# Altium schematic symbol library jlcpcb_2025_04_ferrites_extended_0603.schlib: 833 symbols (part 1 of 4) (continued)
## BLM18EG221TZ1D
designator FB?  Impedance @ Frequency: 220Ω@100MHz
Ferrite, 220Ω@100MHz, ±25%, 150mΩ, 1A, SMD 0603; Manufacturer: Murata Electronics; Manufacturer Part Number: BLM18EG221TZ1D; Package Size: 0603; JLCPCB Basic Part: No; JLCPCB Part Number: C710365; Supplier 1: LCSC; Category: Ferrite Beads; Supplier Part Number 1: C710365; Tolerance: ±25%; Rated Current: 1A; DC Resistance: 150mΩ; RoHS: Yes; ComponentLink1Description: Datasheet; ComponentLink1URL: https://wmsc.lcsc.com/wmsc/upload/file/pdf/v2/lcsc/2304140030_Murata-Electronics-BLM18EG221TZ1D_C710365.pdf; ComponentLink2Description: JLCPCB Part URL; ComponentLink2URL: https://jlcpcb.com/partdetail/C710365; ComponentLink3Description: LCSC Part URL; ComponentLink3URL: https://lcsc.com/product-detail/Ferrite-Beads_Murata-Electronics-Murata-Electronics-BLM18EG221TZ1D_C710365.html
footprint FB-0603 (0603 (1608M) Ferrite)
pins: 1, 2

## BLM18EG331TH1D
designator FB?  Impedance @ Frequency: 330Ω@100MHz
Ferrite, 330Ω@100MHz, ±25%, 210mΩ, 500mA, SMD 0603; Manufacturer: Murata Electronics; Manufacturer Part Number: BLM18EG331TH1D; Package Size: 0603; JLCPCB Basic Part: No; JLCPCB Part Number: C907937; Supplier 1: LCSC; Category: Ferrite Beads; Supplier Part Number 1: C907937; Tolerance: ±25%; Rated Current: 500mA; DC Resistance: 210mΩ; RoHS: Yes; ComponentLink1Description: Datasheet; ComponentLink1URL: https://wmsc.lcsc.com/wmsc/upload/file/pdf/v2/lcsc/2109221630_Murata-Electronics-BLM18EG331TH1D_C907937.pdf; ComponentLink2Description: JLCPCB Part URL; ComponentLink2URL: https://jlcpcb.com/partdetail/C907937; ComponentLink3Description: LCSC Part URL; ComponentLink3URL: https://lcsc.com/product-detail/Ferrite-Beads_Murata-Electronics-Murata-Electronics-BLM18EG331TH1D_C907937.html
footprint FB-0603 (0603 (1608M) Ferrite)
pins: 1, 2

## BLM18EG331TN1D
designator FB?  Impedance @ Frequency: 330Ω@100MHz
Ferrite, 330Ω@100MHz, ±25%, 210mΩ, 500mA, SMD 0603; Manufacturer: Murata Electronics; Manufacturer Part Number: BLM18EG331TN1D; Package Size: 0603; JLCPCB Basic Part: No; JLCPCB Part Number: C341513; Supplier 1: LCSC; Category: Ferrite Beads; Supplier Part Number 1: C341513; Tolerance: ±25%; Rated Current: 500mA; DC Resistance: 210mΩ; RoHS: Yes; ComponentLink1Description: Datasheet; ComponentLink1URL: https://wmsc.lcsc.com/wmsc/upload/file/pdf/v2/lcsc/1912111437_Murata-Electronics-BLM18EG331TN1D_C341513.pdf; ComponentLink2Description: JLCPCB Part URL; ComponentLink2URL: https://jlcpcb.com/partdetail/C341513; ComponentLink3Description: LCSC Part URL; ComponentLink3URL: https://lcsc.com/product-detail/Ferrite-Beads_Murata-Electronics-Murata-Electronics-BLM18EG331TN1D_C341513.html
footprint FB-0603 (0603 (1608M) Ferrite)
pins: 1, 2

## BLM18EG471SN1D
designator FB?  Impedance @ Frequency: 470Ω@100MHz
Ferrite, 470Ω@100MHz, ±25%, 210mΩ, 500mA, SMD 0603; Manufacturer: Murata Electronics; Manufacturer Part Number: BLM18EG471SN1D; Package Size: 0603; JLCPCB Basic Part: No; JLCPCB Part Number: C337880; Supplier 1: LCSC; Category: Ferrite Beads; Supplier Part Number 1: C337880; Tolerance: ±25%; Rated Current: 500mA; DC Resistance: 210mΩ; RoHS: Yes; ComponentLink1Description: Datasheet; ComponentLink1URL: https://wmsc.lcsc.com/wmsc/upload/file/pdf/v2/lcsc/2304140030_Murata-Electronics-BLM18EG471SN1D_C337880.pdf; ComponentLink2Description: JLCPCB Part URL; ComponentLink2URL: https://jlcpcb.com/partdetail/C337880; ComponentLink3Description: LCSC Part URL; ComponentLink3URL: https://lcsc.com/product-detail/Ferrite-Beads_Murata-Electronics-Murata-Electronics-BLM18EG471SN1D_C337880.html
footprint FB-0603 (0603 (1608M) Ferrite)
pins: 1, 2

## BLM18EG601SH1D
designator FB?  Impedance @ Frequency: 600Ω@100MHz
Ferrite, 600Ω@100MHz, 350mΩ, SMD 0603; Manufacturer: Murata Electronics; Manufacturer Part Number: BLM18EG601SH1D; Package Size: 0603; JLCPCB Basic Part: No; JLCPCB Part Number: C180490; Supplier 1: LCSC; Category: Ferrite Beads; Supplier Part Number 1: C180490; DC Resistance: 350mΩ; RoHS: Yes; ComponentLink1Description: Datasheet; ComponentLink1URL: https://wmsc.lcsc.com/wmsc/upload/file/pdf/v2/lcsc/2308111441_Murata-Electronics-BLM18EG601SH1D_C180490.pdf; ComponentLink2Description: JLCPCB Part URL; ComponentLink2URL: https://jlcpcb.com/partdetail/C180490; ComponentLink3Description: LCSC Part URL; ComponentLink3URL: https://lcsc.com/product-detail/Ferrite-Beads_Murata-Electronics-Murata-Electronics-BLM18EG601SH1D_C180490.html
pins: 1, 2

## BLM18EG601SN1D
designator FB?  Impedance @ Frequency: 600Ω@100MHz
Ferrite, 600Ω@100MHz, ±25%, 350mΩ, 500mA, SMD 0603; Manufacturer: Murata Electronics; Manufacturer Part Number: BLM18EG601SN1D; Package Size: 0603; JLCPCB Basic Part: No; JLCPCB Part Number: C20345; Supplier 1: LCSC; Category: Ferrite Beads; Supplier Part Number 1: C20345; Tolerance: ±25%; Rated Current: 500mA; DC Resistance: 350mΩ; RoHS: Yes; ComponentLink1Description: Datasheet; ComponentLink1URL: https://wmsc.lcsc.com/wmsc/upload/file/pdf/v2/lcsc/2304140030_Murata-Electronics-BLM18EG601SN1D_C20345.pdf; ComponentLink2Description: JLCPCB Part URL; ComponentLink2URL: https://jlcpcb.com/partdetail/C20345; ComponentLink3Description: LCSC Part URL; ComponentLink3URL: https://lcsc.com/product-detail/Ferrite-Beads_Murata-Electronics-Murata-Electronics-BLM18EG601SN1D_C20345.html
footprint FB-0603 (0603 (1608M) Ferrite)
pins: 1, 2

## BLM18GG471SN1D
designator FB?  Impedance @ Frequency: 470Ω@100MHz
Ferrite, 470Ω@100MHz, ±25%, 1Ω, 200mA, SMD 0603; Manufacturer: Murata Electronics; Manufacturer Part Number: BLM18GG471SN1D; Package Size: 0603; JLCPCB Basic Part: No; JLCPCB Part Number: C88977; Supplier 1: LCSC; Category: Ferrite Beads; Supplier Part Number 1: C88977; Tolerance: ±25%; Rated Current: 200mA; DC Resistance: 1Ω; RoHS: Yes; ComponentLink1Description: Datasheet; ComponentLink1URL: https://wmsc.lcsc.com/wmsc/upload/file/pdf/v2/lcsc/1810311122_Murata-Electronics-BLM18GG471SN1D_C88977.pdf; ComponentLink2Description: JLCPCB Part URL; ComponentLink2URL: https://jlcpcb.com/partdetail/C88977; ComponentLink3Description: LCSC Part URL; ComponentLink3URL: https://lcsc.com/product-detail/Ferrite-Beads_Murata-Electronics-Murata-Electronics-BLM18GG471SN1D_C88977.html
footprint FB-0603 (0603 (1608M) Ferrite)
pins: 1, 2

## BLM18HB121SN1D
designator FB?  Impedance @ Frequency: 120Ω@100MHz
Ferrite, 120Ω@100MHz, ±25%, 500mΩ, 200mA, SMD 0603; Manufacturer: Murata Electronics; Manufacturer Part Number: BLM18HB121SN1D; Package Size: 0603; JLCPCB Basic Part: No; JLCPCB Part Number: C14710; Supplier 1: LCSC; Category: Ferrite Beads; Supplier Part Number 1: C14710; Tolerance: ±25%; Rated Current: 200mA; DC Resistance: 500mΩ; RoHS: Yes; ComponentLink1Description: Datasheet; ComponentLink1URL: https://wmsc.lcsc.com/wmsc/upload/file/pdf/v2/lcsc/2304140030_Murata-Electronics-BLM18HB121SN1D_C14710.pdf; ComponentLink2Description: JLCPCB Part URL; ComponentLink2URL: https://jlcpcb.com/partdetail/C14710; ComponentLink3Description: LCSC Part URL; ComponentLink3URL: https://lcsc.com/product-detail/Ferrite-Beads_Murata-Electronics-Murata-Electronics-BLM18HB121SN1D_C14710.html
footprint FB-0603 (0603 (1608M) Ferrite)
pins: 1, 2

## BLM18HB221SN1D
designator FB?  Impedance @ Frequency: 220Ω@100MHz
Ferrite, 220Ω@100MHz, ±25%, 800mΩ, 100mA, SMD 0603; Manufacturer: Murata Electronics; Manufacturer Part Number: BLM18HB221SN1D; Package Size: 0603; JLCPCB Basic Part: No; JLCPCB Part Number: C437401; Supplier 1: LCSC; Category: Ferrite Beads; Supplier Part Number 1: C437401; Tolerance: ±25%; Rated Current: 100mA; DC Resistance: 800mΩ; RoHS: Yes; ComponentLink1Description: Datasheet; ComponentLink1URL: https://wmsc.lcsc.com/wmsc/upload/file/pdf/v2/lcsc/2304140030_Murata-Electronics-BLM18HB221SN1D_C437401.pdf; ComponentLink2Description: JLCPCB Part URL; ComponentLink2URL: https://jlcpcb.com/partdetail/C437401; ComponentLink3Description: LCSC Part URL; ComponentLink3URL: https://lcsc.com/product-detail/Ferrite-Beads_Murata-Electronics-Murata-Electronics-BLM18HB221SN1D_C437401.html
footprint FB-0603 (0603 (1608M) Ferrite)
pins: 1, 2

## BLM18HB331SN1D
designator FB?  Impedance @ Frequency: 330Ω@100MHz
Ferrite, 330Ω@100MHz, ±25%, 1.2Ω, 50mA, SMD 0603; Manufacturer: Murata Electronics; Manufacturer Part Number: BLM18HB331SN1D; Package Size: 0603; JLCPCB Basic Part: No; JLCPCB Part Number: C701277; Supplier 1: LCSC; Category: Ferrite Beads; Supplier Part Number 1: C701277; Tolerance: ±25%; Rated Current: 50mA; DC Resistance: 1.2Ω; RoHS: Yes; ComponentLink1Description: Datasheet; ComponentLink1URL: https://wmsc.lcsc.com/wmsc/upload/file/pdf/v2/lcsc/2010151208_Murata-Electronics-BLM18HB331SN1D_C701277.pdf; ComponentLink2Description: JLCPCB Part URL; ComponentLink2URL: https://jlcpcb.com/partdetail/C701277; ComponentLink3Description: LCSC Part URL; ComponentLink3URL: https://lcsc.com/product-detail/Ferrite-Beads_Murata-Electronics-Murata-Electronics-BLM18HB331SN1D_C701277.html
footprint FB-0603 (0603 (1608M) Ferrite)
pins: 1, 2

## BLM18HD102SH1D
designator FB?  Impedance @ Frequency: 1kΩ@100MHz
Ferrite, 1kΩ@100MHz, ±25%, 1.8Ω, 50mA, SMD 0603; Manufacturer: Murata Electronics; Manufacturer Part Number: BLM18HD102SH1D; Package Size: 0603; JLCPCB Basic Part: No; JLCPCB Part Number: C440132; Supplier 1: LCSC; Category: Ferrite Beads; Supplier Part Number 1: C440132; Tolerance: ±25%; Rated Current: 50mA; DC Resistance: 1.8Ω; RoHS: Yes; ComponentLink1Description: Datasheet; ComponentLink1URL: https://wmsc.lcsc.com/wmsc/upload/file/pdf/v2/lcsc/2304140030_Murata-Electronics-BLM18HD102SH1D_C440132.pdf; ComponentLink2Description: JLCPCB Part URL; ComponentLink2URL: https://jlcpcb.com/partdetail/C440132; ComponentLink3Description: LCSC Part URL; ComponentLink3URL: https://lcsc.com/product-detail/Ferrite-Beads_Murata-Electronics-Murata-Electronics-BLM18HD102SH1D_C440132.html
footprint FB-0603 (0603 (1608M) Ferrite)
pins: 1, 2

## BLM18HD102SN1D
designator FB?  Impedance @ Frequency: 1kΩ@100MHz
Ferrite, 1kΩ@100MHz, ±25%, 1.8Ω, 50mA, SMD 0603; Manufacturer: Murata Electronics; Manufacturer Part Number: BLM18HD102SN1D; Package Size: 0603; JLCPCB Basic Part: No; JLCPCB Part Number: C113026; Supplier 1: LCSC; Category: Ferrite Beads; Supplier Part Number 1: C113026; Tolerance: ±25%; Rated Current: 50mA; DC Resistance: 1.8Ω; RoHS: Yes; ComponentLink1Description: Datasheet; ComponentLink1URL: https://wmsc.lcsc.com/wmsc/upload/file/pdf/v2/lcsc/2304140030_Murata-Electronics-BLM18HD102SN1D_C113026.pdf; ComponentLink2Description: JLCPCB Part URL; ComponentLink2URL: https://jlcpcb.com/partdetail/C113026; ComponentLink3Description: LCSC Part URL; ComponentLink3URL: https://lcsc.com/product-detail/Ferrite-Beads_Murata-Electronics-Murata-Electronics-BLM18HD102SN1D_C113026.html
footprint FB-0603 (0603 (1608M) Ferrite)
pins: 1, 2

## BLM18HD471SH1D
designator FB?  Impedance @ Frequency: 470Ω@100MHz
Ferrite, 470Ω@100MHz, ±25%, 1.2Ω, 100mA, SMD 0603; Manufacturer: Murata Electronics; Manufacturer Part Number: BLM18HD471SH1D; Package Size: 0603; JLCPCB Basic Part: No; JLCPCB Part Number: C1852587; Supplier 1: LCSC; Category: Ferrite Beads; Supplier Part Number 1: C1852587; Tolerance: ±25%; Rated Current: 100mA; DC Resistance: 1.2Ω; RoHS: Yes; ComponentLink1Description: Datasheet; ComponentLink1URL: https://wmsc.lcsc.com/wmsc/upload/file/pdf/v2/lcsc/2201271000_Murata-Electronics-BLM18HD471SH1D_C1852587.pdf; ComponentLink2Description: JLCPCB Part URL; ComponentLink2URL: https://jlcpcb.com/partdetail/C1852587; ComponentLink3Description: LCSC Part URL; ComponentLink3URL: https://lcsc.com/product-detail/Ferrite-Beads_Murata-Electronics-Murata-Electronics-BLM18HD471SH1D_C1852587.html
footprint FB-0603 (0603 (1608M) Ferrite)
pins: 1, 2

## BLM18HD471SN1D
designator FB?  Impedance @ Frequency: 470Ω@100MHz
Ferrite, 470Ω@100MHz, ±25%, 1.2Ω, 100mA, SMD 0603; Manufacturer: Murata Electronics; Manufacturer Part Number: BLM18HD471SN1D; Package Size: 0603; JLCPCB Basic Part: No; JLCPCB Part Number: C113027; Supplier 1: LCSC; Category: Ferrite Beads; Supplier Part Number 1: C113027; Tolerance: ±25%; Rated Current: 100mA; DC Resistance: 1.2Ω; RoHS: Yes; ComponentLink1Description: Datasheet; ComponentLink1URL: https://wmsc.lcsc.com/wmsc/upload/file/pdf/v2/lcsc/2304140030_Murata-Electronics-BLM18HD471SN1D_C113027.pdf; ComponentLink2Description: JLCPCB Part URL; ComponentLink2URL: https://jlcpcb.com/partdetail/C113027; ComponentLink3Description: LCSC Part URL; ComponentLink3URL: https://lcsc.com/product-detail/Ferrite-Beads_Murata-Electronics-Murata-Electronics-BLM18HD471SN1D_C113027.html
footprint FB-0603 (0603 (1608M) Ferrite)
pins: 1, 2

## BLM18HD601SH1D
designator FB?  Impedance @ Frequency: 600Ω@100MHz
Ferrite, 600Ω@100MHz, ±25%, 1.5Ω, 100mA, SMD 0603; Manufacturer: Murata Electronics; Manufacturer Part Number: BLM18HD601SH1D; Package Size: 0603; JLCPCB Basic Part: No; JLCPCB Part Number: C437402; Supplier 1: LCSC; Category: Ferrite Beads; Supplier Part Number 1: C437402; Tolerance: ±25%; Rated Current: 100mA; DC Resistance: 1.5Ω; RoHS: Yes; ComponentLink1Description: Datasheet; ComponentLink1URL: https://wmsc.lcsc.com/wmsc/upload/file/pdf/v2/lcsc/2304140030_Murata-Electronics-BLM18HD601SH1D_C437402.pdf; ComponentLink2Description: JLCPCB Part URL; ComponentLink2URL: https://jlcpcb.com/partdetail/C437402; ComponentLink3Description: LCSC Part URL; ComponentLink3URL: https://lcsc.com/product-detail/Ferrite-Beads_Murata-Electronics-Murata-Electronics-BLM18HD601SH1D_C437402.html
footprint FB-0603 (0603 (1608M) Ferrite)
pins: 1, 2

## BLM18HD601SN1D
designator FB?  Impedance @ Frequency: 600Ω@100MHz
Ferrite, 600Ω@100MHz, ±25%, 1.5Ω, 100mA, SMD 0603; Manufacturer: Murata Electronics; Manufacturer Part Number: BLM18HD601SN1D; Package Size: 0603; JLCPCB Basic Part: No; JLCPCB Part Number: C88978; Supplier 1: LCSC; Category: Ferrite Beads; Supplier Part Number 1: C88978; Tolerance: ±25%; Rated Current: 100mA; DC Resistance: 1.5Ω; RoHS: Yes; ComponentLink1Description: Datasheet; ComponentLink1URL: https://wmsc.lcsc.com/wmsc/upload/file/pdf/v2/lcsc/2304140030_Murata-Electronics-BLM18HD601SN1D_C88978.pdf; ComponentLink2Description: JLCPCB Part URL; ComponentLink2URL: https://jlcpcb.com/partdetail/C88978; ComponentLink3Description: LCSC Part URL; ComponentLink3URL: https://lcsc.com/product-detail/Ferrite-Beads_Murata-Electronics-Murata-Electronics-BLM18HD601SN1D_C88978.html
footprint FB-0603 (0603 (1608M) Ferrite)
pins: 1, 2

## BLM18HE102SN1D
designator FB?  Impedance @ Frequency: 1kΩ@100MHz
Ferrite, 1kΩ@100MHz, ±25%, 350mΩ, 600mA, SMD 0603; Manufacturer: Murata Electronics; Manufacturer Part Number: BLM18HE102SN1D; Package Size: 0603; JLCPCB Basic Part: No; JLCPCB Part Number: C85828; Supplier 1: LCSC; Category: Ferrite Beads; Supplier Part Number 1: C85828; Tolerance: ±25%; Rated Current: 600mA; DC Resistance: 350mΩ; RoHS: Yes; ComponentLink1Description: Datasheet; ComponentLink1URL: https://wmsc.lcsc.com/wmsc/upload/file/pdf/v2/lcsc/2304140030_Murata-Electronics-BLM18HE102SN1D_C85828.pdf; ComponentLink2Description: JLCPCB Part URL; ComponentLink2URL: https://jlcpcb.com/partdetail/C85828; ComponentLink3Description: LCSC Part URL; ComponentLink3URL: https://lcsc.com/product-detail/Ferrite-Beads_Murata-Electronics-Murata-Electronics-BLM18HE102SN1D_C85828.html
footprint FB-0603 (0603 (1608M) Ferrite)
pins: 1, 2

## BLM18HE102SZ1D
designator FB?  Impedance @ Frequency: 1kΩ@100MHz
Ferrite, 1kΩ@100MHz, ±25%, 350mΩ, 600mA, SMD 0603; Manufacturer: Murata Electronics; Manufacturer Part Number: BLM18HE102SZ1D; Package Size: 0603; JLCPCB Basic Part: No; JLCPCB Part Number: C524529; Supplier 1: LCSC; Category: Ferrite Beads; Supplier Part Number 1: C524529; Tolerance: ±25%; Rated Current: 600mA; DC Resistance: 350mΩ; RoHS: Yes; ComponentLink1Description: Datasheet; ComponentLink1URL: https://wmsc.lcsc.com/wmsc/upload/file/pdf/v2/lcsc/2007031830_Murata-Electronics-BLM18HE102SZ1D_C524529.pdf; ComponentLink2Description: JLCPCB Part URL; ComponentLink2URL: https://jlcpcb.com/partdetail/C524529; ComponentLink3Description: LCSC Part URL; ComponentLink3URL: https://lcsc.com/product-detail/Ferrite-Beads_Murata-Electronics-Murata-Electronics-BLM18HE102SZ1D_C524529.html
footprint FB-0603 (0603 (1608M) Ferrite)
pins: 1, 2

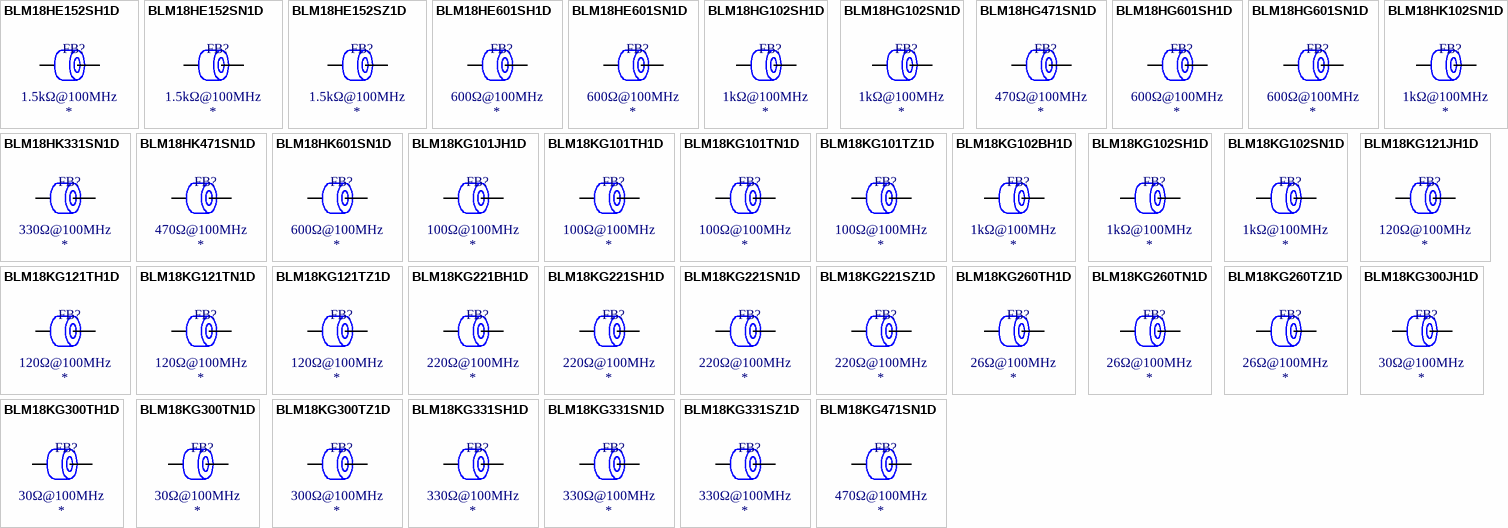
[diagram p3: symbols BLM18HE152SH1D to BLM18KG471SN1D]

## BLM18HE152SH1D
designator FB?  Impedance @ Frequency: 1.5kΩ@100MHz
Ferrite, 1.5kΩ@100MHz, ±25%, 500mΩ, 500mA, SMD 0603; Manufacturer: Murata Electronics; Manufacturer Part Number: BLM18HE152SH1D; Package Size: 0603; JLCPCB Basic Part: No; JLCPCB Part Number: C596494; Supplier 1: LCSC; Category: Ferrite Beads; Supplier Part Number 1: C596494; Tolerance: ±25%; Rated Current: 500mA; DC Resistance: 500mΩ; RoHS: Yes; ComponentLink1Description: Datasheet; ComponentLink1URL: https://wmsc.lcsc.com/wmsc/upload/file/pdf/v2/lcsc/2304140030_Murata-Electronics-BLM18HE152SH1D_C596494.pdf; ComponentLink2Description: JLCPCB Part URL; ComponentLink2URL: https://jlcpcb.com/partdetail/C596494; ComponentLink3Description: LCSC Part URL; ComponentLink3URL: https://lcsc.com/product-detail/Ferrite-Beads_Murata-Electronics-Murata-Electronics-BLM18HE152SH1D_C596494.html
footprint FB-0603 (0603 (1608M) Ferrite)
pins: 1, 2

## BLM18HE152SN1D
designator FB?  Impedance @ Frequency: 1.5kΩ@100MHz
Ferrite, 1.5kΩ@100MHz, ±25%, 500mΩ, 500mA, SMD 0603; Manufacturer: Murata Electronics; Manufacturer Part Number: BLM18HE152SN1D; Package Size: 0603; JLCPCB Basic Part: No; JLCPCB Part Number: C82155; Supplier 1: LCSC; Category: Ferrite Beads; Supplier Part Number 1: C82155; Tolerance: ±25%; Rated Current: 500mA; DC Resistance: 500mΩ; RoHS: Yes; ComponentLink1Description: Datasheet; ComponentLink1URL: https://wmsc.lcsc.com/wmsc/upload/file/pdf/v2/lcsc/2304140030_Murata-Electronics-BLM18HE152SN1D_C82155.pdf; ComponentLink2Description: JLCPCB Part URL; ComponentLink2URL: https://jlcpcb.com/partdetail/C82155; ComponentLink3Description: LCSC Part URL; ComponentLink3URL: https://lcsc.com/product-detail/Ferrite-Beads_Murata-Electronics-Murata-Electronics-BLM18HE152SN1D_C82155.html
footprint FB-0603 (0603 (1608M) Ferrite)
pins: 1, 2

## BLM18HE152SZ1D
designator FB?  Impedance @ Frequency: 1.5kΩ@100MHz
Ferrite, 1.5kΩ@100MHz, ±25%, 500mΩ, 500mA, SMD 0603; Manufacturer: Murata Electronics; Manufacturer Part Number: BLM18HE152SZ1D; Package Size: 0603; JLCPCB Basic Part: No; JLCPCB Part Number: C437403; Supplier 1: LCSC; Category: Ferrite Beads; Supplier Part Number 1: C437403; Tolerance: ±25%; Rated Current: 500mA; DC Resistance: 500mΩ; RoHS: Yes; ComponentLink1Description: Datasheet; ComponentLink1URL: https://wmsc.lcsc.com/wmsc/upload/file/pdf/v2/lcsc/2304140030_Murata-Electronics-BLM18HE152SZ1D_C437403.pdf; ComponentLink2Description: JLCPCB Part URL; ComponentLink2URL: https://jlcpcb.com/partdetail/C437403; ComponentLink3Description: LCSC Part URL; ComponentLink3URL: https://lcsc.com/product-detail/Ferrite-Beads_Murata-Electronics-Murata-Electronics-BLM18HE152SZ1D_C437403.html
footprint FB-0603 (0603 (1608M) Ferrite)
pins: 1, 2

## BLM18HE601SH1D
designator FB?  Impedance @ Frequency: 600Ω@100MHz
Ferrite, 600Ω@100MHz, ±25%, 250mΩ, 800mA, SMD 0603; Manufacturer: Murata Electronics; Manufacturer Part Number: BLM18HE601SH1D; Package Size: 0603; JLCPCB Basic Part: No; JLCPCB Part Number: C882978; Supplier 1: LCSC; Category: Ferrite Beads; Supplier Part Number 1: C882978; Tolerance: ±25%; Rated Current: 800mA; DC Resistance: 250mΩ; RoHS: Yes; ComponentLink1Description: Datasheet; ComponentLink1URL: https://wmsc.lcsc.com/wmsc/upload/file/pdf/v2/lcsc/2201242130_Murata-Electronics-BLM18HE601SH1D_C882978.pdf; ComponentLink2Description: JLCPCB Part URL; ComponentLink2URL: https://jlcpcb.com/partdetail/C882978; ComponentLink3Description: LCSC Part URL; ComponentLink3URL: https://lcsc.com/product-detail/Ferrite-Beads_Murata-Electronics-Murata-Electronics-BLM18HE601SH1D_C882978.html
footprint FB-0603 (0603 (1608M) Ferrite)
pins: 1, 2

## BLM18HE601SN1D
designator FB?  Impedance @ Frequency: 600Ω@100MHz
Ferrite, 600Ω@100MHz, ±25%, 250mΩ, 800mA, SMD 0603; Manufacturer: Murata Electronics; Manufacturer Part Number: BLM18HE601SN1D; Package Size: 0603; JLCPCB Basic Part: No; JLCPCB Part Number: C88979; Supplier 1: LCSC; Category: Ferrite Beads; Supplier Part Number 1: C88979; Tolerance: ±25%; Rated Current: 800mA; DC Resistance: 250mΩ; RoHS: Yes; ComponentLink1Description: Datasheet; ComponentLink1URL: https://wmsc.lcsc.com/wmsc/upload/file/pdf/v2/lcsc/2304140030_Murata-Electronics-BLM18HE601SN1D_C88979.pdf; ComponentLink2Description: JLCPCB Part URL; ComponentLink2URL: https://jlcpcb.com/partdetail/C88979; ComponentLink3Description: LCSC Part URL; ComponentLink3URL: https://lcsc.com/product-detail/Ferrite-Beads_Murata-Electronics-Murata-Electronics-BLM18HE601SN1D_C88979.html
footprint FB-0603 (0603 (1608M) Ferrite)
pins: 1, 2

## BLM18HG102SH1D
designator FB?  Impedance @ Frequency: 1kΩ@100MHz
Ferrite, 1kΩ@100MHz, 1.6Ω, SMD 0603; Manufacturer: Murata Electronics; Manufacturer Part Number: BLM18HG102SH1D; Package Size: 0603; JLCPCB Basic Part: No; JLCPCB Part Number: C527979; Supplier 1: LCSC; Category: Ferrite Beads; Supplier Part Number 1: C527979; DC Resistance: 1.6Ω; RoHS: Yes; ComponentLink1Description: Datasheet; ComponentLink1URL: https://wmsc.lcsc.com/wmsc/upload/file/pdf/v2/lcsc/2304140030_Murata-Electronics-BLM18HG102SH1D_C527979.pdf; ComponentLink2Description: JLCPCB Part URL; ComponentLink2URL: https://jlcpcb.com/partdetail/C527979; ComponentLink3Description: LCSC Part URL; ComponentLink3URL: https://lcsc.com/product-detail/Ferrite-Beads_Murata-Electronics-Murata-Electronics-BLM18HG102SH1D_C527979.html
pins: 1, 2

## BLM18HG102SN1D
designator FB?  Impedance @ Frequency: 1kΩ@100MHz
Ferrite, 1kΩ@100MHz, ±25%, 1.6Ω, 100mA, SMD 0603; Manufacturer: Murata Electronics; Manufacturer Part Number: BLM18HG102SN1D; Package Size: 0603; JLCPCB Basic Part: No; JLCPCB Part Number: C82848; Supplier 1: LCSC; Category: Ferrite Beads; Supplier Part Number 1: C82848; Tolerance: ±25%; Rated Current: 100mA; DC Resistance: 1.6Ω; RoHS: Yes; ComponentLink1Description: Datasheet; ComponentLink1URL: https://wmsc.lcsc.com/wmsc/upload/file/pdf/v2/lcsc/2304140030_Murata-Electronics-BLM18HG102SN1D_C82848.pdf; ComponentLink2Description: JLCPCB Part URL; ComponentLink2URL: https://jlcpcb.com/partdetail/C82848; ComponentLink3Description: LCSC Part URL; ComponentLink3URL: https://lcsc.com/product-detail/Ferrite-Beads_Murata-Electronics-Murata-Electronics-BLM18HG102SN1D_C82848.html
footprint FB-0603 (0603 (1608M) Ferrite)
pins: 1, 2

## BLM18HG471SN1D
designator FB?  Impedance @ Frequency: 470Ω@100MHz
Ferrite, 470Ω@100MHz, ±25%, 850mΩ, 200mA, SMD 0603; Manufacturer: Murata Electronics; Manufacturer Part Number: BLM18HG471SN1D; Package Size: 0603; JLCPCB Basic Part: No; JLCPCB Part Number: C85829; Supplier 1: LCSC; Category: Ferrite Beads; Supplier Part Number 1: C85829; Tolerance: ±25%; Rated Current: 200mA; DC Resistance: 850mΩ; RoHS: Yes; ComponentLink1Description: Datasheet; ComponentLink1URL: https://wmsc.lcsc.com/wmsc/upload/file/pdf/v2/lcsc/2304140030_Murata-Electronics-BLM18HG471SN1D_C85829.pdf; ComponentLink2Description: JLCPCB Part URL; ComponentLink2URL: https://jlcpcb.com/partdetail/C85829; ComponentLink3Description: LCSC Part URL; ComponentLink3URL: https://lcsc.com/product-detail/Ferrite-Beads_Murata-Electronics-Murata-Electronics-BLM18HG471SN1D_C85829.html
footprint FB-0603 (0603 (1608M) Ferrite)
pins: 1, 2

## BLM18HG601SH1D
designator FB?  Impedance @ Frequency: 600Ω@100MHz
Ferrite, 600Ω@100MHz, 1Ω, SMD 0603; Manufacturer: Murata Electronics; Manufacturer Part Number: BLM18HG601SH1D; Package Size: 0603; JLCPCB Basic Part: No; JLCPCB Part Number: C711568; Supplier 1: LCSC; Category: Ferrite Beads; Supplier Part Number 1: C711568; DC Resistance: 1Ω; RoHS: Yes; ComponentLink1Description: Datasheet; ComponentLink1URL: https://wmsc.lcsc.com/wmsc/upload/file/pdf/v2/lcsc/2304140030_Murata-Electronics-BLM18HG601SH1D_C711568.pdf; ComponentLink2Description: JLCPCB Part URL; ComponentLink2URL: https://jlcpcb.com/partdetail/C711568; ComponentLink3Description: LCSC Part URL; ComponentLink3URL: https://lcsc.com/product-detail/Ferrite-Beads_Murata-Electronics-Murata-Electronics-BLM18HG601SH1D_C711568.html
pins: 1, 2

## BLM18HG601SN1D
designator FB?  Impedance @ Frequency: 600Ω@100MHz
Ferrite, 600Ω@100MHz, ±25%, 1Ω, 200mA, SMD 0603; Manufacturer: Murata Electronics; Manufacturer Part Number: BLM18HG601SN1D; Package Size: 0603; JLCPCB Basic Part: No; JLCPCB Part Number: C85830; Supplier 1: LCSC; Category: Ferrite Beads; Supplier Part Number 1: C85830; Tolerance: ±25%; Rated Current: 200mA; DC Resistance: 1Ω; RoHS: Yes; ComponentLink1Description: Datasheet; ComponentLink1URL: https://wmsc.lcsc.com/wmsc/upload/file/pdf/v2/lcsc/2304140030_Murata-Electronics-BLM18HG601SN1D_C85830.pdf; ComponentLink2Description: JLCPCB Part URL; ComponentLink2URL: https://jlcpcb.com/partdetail/C85830; ComponentLink3Description: LCSC Part URL; ComponentLink3URL: https://lcsc.com/product-detail/Ferrite-Beads_Murata-Electronics-Murata-Electronics-BLM18HG601SN1D_C85830.html
footprint FB-0603 (0603 (1608M) Ferrite)
pins: 1, 2

## BLM18HK102SN1D
designator FB?  Impedance @ Frequency: 1kΩ@100MHz
Ferrite, 1kΩ@100MHz, ±25%, 1.5Ω, 50mA, SMD 0603; Manufacturer: Murata Electronics; Manufacturer Part Number: BLM18HK102SN1D; Package Size: 0603; JLCPCB Basic Part: No; JLCPCB Part Number: C97852; Supplier 1: LCSC; Category: Ferrite Beads; Supplier Part Number 1: C97852; Tolerance: ±25%; Rated Current: 50mA; DC Resistance: 1.5Ω; RoHS: Yes; ComponentLink1Description: Datasheet; ComponentLink1URL: https://wmsc.lcsc.com/wmsc/upload/file/pdf/v2/lcsc/2304140030_Murata-Electronics-BLM18HK102SN1D_C97852.pdf; ComponentLink2Description: JLCPCB Part URL; ComponentLink2URL: https://jlcpcb.com/partdetail/C97852; ComponentLink3Description: LCSC Part URL; ComponentLink3URL: https://lcsc.com/product-detail/Ferrite-Beads_Murata-Electronics-Murata-Electronics-BLM18HK102SN1D_C97852.html
footprint FB-0603 (0603 (1608M) Ferrite)
pins: 1, 2

## BLM18HK331SN1D
designator FB?  Impedance @ Frequency: 330Ω@100MHz
Ferrite, 330Ω@100MHz, ±25%, 500mΩ, 200mA, SMD 0603; Manufacturer: Murata Electronics; Manufacturer Part Number: BLM18HK331SN1D; Package Size: 0603; JLCPCB Basic Part: No; JLCPCB Part Number: C341514; Supplier 1: LCSC; Category: Ferrite Beads; Supplier Part Number 1: C341514; Tolerance: ±25%; Rated Current: 200mA; DC Resistance: 500mΩ; RoHS: Yes; ComponentLink1Description: Datasheet; ComponentLink1URL: https://wmsc.lcsc.com/wmsc/upload/file/pdf/v2/lcsc/2304140030_Murata-Electronics-BLM18HK331SN1D_C341514.pdf; ComponentLink2Description: JLCPCB Part URL; ComponentLink2URL: https://jlcpcb.com/partdetail/C341514; ComponentLink3Description: LCSC Part URL; ComponentLink3URL: https://lcsc.com/product-detail/Ferrite-Beads_Murata-Electronics-Murata-Electronics-BLM18HK331SN1D_C341514.html
footprint FB-0603 (0603 (1608M) Ferrite)
pins: 1, 2

## BLM18HK471SN1D
designator FB?  Impedance @ Frequency: 470Ω@100MHz
Ferrite, 470Ω@100MHz, ±25%, 700mΩ, 200mA, SMD 0603; Manufacturer: Murata Electronics; Manufacturer Part Number: BLM18HK471SN1D; Package Size: 0603; JLCPCB Basic Part: No; JLCPCB Part Number: C113028; Supplier 1: LCSC; Category: Ferrite Beads; Supplier Part Number 1: C113028; Tolerance: ±25%; Rated Current: 200mA; DC Resistance: 700mΩ; RoHS: Yes; ComponentLink1Description: Datasheet; ComponentLink1URL: https://wmsc.lcsc.com/wmsc/upload/file/pdf/v2/lcsc/2304140030_Murata-Electronics-BLM18HK471SN1D_C113028.pdf; ComponentLink2Description: JLCPCB Part URL; ComponentLink2URL: https://jlcpcb.com/partdetail/C113028; ComponentLink3Description: LCSC Part URL; ComponentLink3URL: https://lcsc.com/product-detail/Ferrite-Beads_Murata-Electronics-Murata-Electronics-BLM18HK471SN1D_C113028.html
footprint FB-0603 (0603 (1608M) Ferrite)
pins: 1, 2

## BLM18HK601SN1D
designator FB?  Impedance @ Frequency: 600Ω@100MHz
Ferrite, 600Ω@100MHz, ±25%, 900mΩ, 100mA, SMD 0603; Manufacturer: Murata Electronics; Manufacturer Part Number: BLM18HK601SN1D; Package Size: 0603; JLCPCB Basic Part: No; JLCPCB Part Number: C160980; Supplier 1: LCSC; Category: Ferrite Beads; Supplier Part Number 1: C160980; Tolerance: ±25%; Rated Current: 100mA; DC Resistance: 900mΩ; RoHS: Yes; ComponentLink1Description: Datasheet; ComponentLink1URL: https://wmsc.lcsc.com/wmsc/upload/file/pdf/v2/lcsc/1810311132_Murata-Electronics-BLM18HK601SN1D_C160980.pdf; ComponentLink2Description: JLCPCB Part URL; ComponentLink2URL: https://jlcpcb.com/partdetail/C160980; ComponentLink3Description: LCSC Part URL; ComponentLink3URL: https://lcsc.com/product-detail/Ferrite-Beads_Murata-Electronics-Murata-Electronics-BLM18HK601SN1D_C160980.html
footprint FB-0603 (0603 (1608M) Ferrite)
pins: 1, 2

## BLM18KG101JH1D
designator FB?  Impedance @ Frequency: 100Ω@100MHz
Ferrite, 100Ω@100MHz, ±25%, 30mΩ, 1.9A, SMD 0603; Manufacturer: Murata Electronics; Manufacturer Part Number: BLM18KG101JH1D; Package Size: 0603; JLCPCB Basic Part: No; JLCPCB Part Number: C2661642; Supplier 1: LCSC; Category: Ferrite Beads; Supplier Part Number 1: C2661642; Tolerance: ±25%; Rated Current: 1.9A; DC Resistance: 30mΩ; RoHS: Yes; ComponentLink1Description: Datasheet; ComponentLink1URL: https://wmsc.lcsc.com/wmsc/upload/file/pdf/v2/lcsc/2304140030_Murata-Electronics-BLM18KG101JH1D_C2661642.pdf; ComponentLink2Description: JLCPCB Part URL; ComponentLink2URL: https://jlcpcb.com/partdetail/C2661642; ComponentLink3Description: LCSC Part URL; ComponentLink3URL: https://lcsc.com/product-detail/Ferrite-Beads_Murata-Electronics-Murata-Electronics-BLM18KG101JH1D_C2661642.html
footprint FB-0603 (0603 (1608M) Ferrite)
pins: 1, 2

## BLM18KG101TH1D
designator FB?  Impedance @ Frequency: 100Ω@100MHz
Ferrite, 100Ω@100MHz, ±25%, 300mΩ, 3A, SMD 0603; Manufacturer: Murata Electronics; Manufacturer Part Number: BLM18KG101TH1D; Package Size: 0603; JLCPCB Basic Part: No; JLCPCB Part Number: C710370; Supplier 1: LCSC; Category: Ferrite Beads; Supplier Part Number 1: C710370; Tolerance: ±25%; Rated Current: 3A; DC Resistance: 300mΩ; RoHS: Yes; ComponentLink1Description: Datasheet; ComponentLink1URL: https://wmsc.lcsc.com/wmsc/upload/file/pdf/v2/lcsc/2304140030_Murata-Electronics-BLM18KG101TH1D_C710370.pdf; ComponentLink2Description: JLCPCB Part URL; ComponentLink2URL: https://jlcpcb.com/partdetail/C710370; ComponentLink3Description: LCSC Part URL; ComponentLink3URL: https://lcsc.com/product-detail/Ferrite-Beads_Murata-Electronics-Murata-Electronics-BLM18KG101TH1D_C710370.html
footprint FB-0603 (0603 (1608M) Ferrite)
pins: 1, 2

## BLM18KG101TN1D
designator FB?  Impedance @ Frequency: 100Ω@100MHz
Ferrite, 100Ω@100MHz, ±25%, 300mΩ, 3A, SMD 0603; Manufacturer: Murata Electronics; Manufacturer Part Number: BLM18KG101TN1D; Package Size: 0603; JLCPCB Basic Part: No; JLCPCB Part Number: C160981; Supplier 1: LCSC; Category: Ferrite Beads; Supplier Part Number 1: C160981; Tolerance: ±25%; Rated Current: 3A; DC Resistance: 300mΩ; RoHS: Yes; ComponentLink1Description: Datasheet; ComponentLink1URL: https://wmsc.lcsc.com/wmsc/upload/file/pdf/v2/lcsc/2304140030_Murata-Electronics-BLM18KG101TN1D_C160981.pdf; ComponentLink2Description: JLCPCB Part URL; ComponentLink2URL: https://jlcpcb.com/partdetail/C160981; ComponentLink3Description: LCSC Part URL; ComponentLink3URL: https://lcsc.com/product-detail/Ferrite-Beads_Murata-Electronics-Murata-Electronics-BLM18KG101TN1D_C160981.html
footprint FB-0603 (0603 (1608M) Ferrite)
pins: 1, 2

## BLM18KG101TZ1D
designator FB?  Impedance @ Frequency: 100Ω@100MHz
Ferrite, 100Ω@100MHz, ±25%, 30mΩ, 3A, SMD 0603; Manufacturer: Murata Electronics; Manufacturer Part Number: BLM18KG101TZ1D; Package Size: 0603; JLCPCB Basic Part: No; JLCPCB Part Number: C883583; Supplier 1: LCSC; Category: Ferrite Beads; Supplier Part Number 1: C883583; Tolerance: ±25%; Rated Current: 3A; DC Resistance: 30mΩ; RoHS: Yes; ComponentLink1Description: Datasheet; ComponentLink1URL: https://wmsc.lcsc.com/wmsc/upload/file/pdf/v2/lcsc/2201131200_Murata-Electronics-BLM18KG101TZ1D_C883583.pdf; ComponentLink2Description: JLCPCB Part URL; ComponentLink2URL: https://jlcpcb.com/partdetail/C883583; ComponentLink3Description: LCSC Part URL; ComponentLink3URL: https://lcsc.com/product-detail/Ferrite-Beads_Murata-Electronics-Murata-Electronics-BLM18KG101TZ1D_C883583.html
footprint FB-0603 (0603 (1608M) Ferrite)
pins: 1, 2

## BLM18KG102BH1D
designator FB?  Impedance @ Frequency: 1kΩ@100MHz
Ferrite, 1kΩ@100MHz, ±25%, 200mΩ, 800mA, SMD 0603; Manufacturer: Murata Electronics; Manufacturer Part Number: BLM18KG102BH1D; Package Size: 0603; JLCPCB Basic Part: No; JLCPCB Part Number: C560058; Supplier 1: LCSC; Category: Ferrite Beads; Supplier Part Number 1: C560058; Tolerance: ±25%; Rated Current: 800mA; DC Resistance: 200mΩ; RoHS: Yes; ComponentLink1Description: Datasheet; ComponentLink1URL: https://wmsc.lcsc.com/wmsc/upload/file/pdf/v2/lcsc/2304140030_Murata-Electronics-BLM18KG102BH1D_C560058.pdf; ComponentLink2Description: JLCPCB Part URL; ComponentLink2URL: https://jlcpcb.com/partdetail/C560058; ComponentLink3Description: LCSC Part URL; ComponentLink3URL: https://lcsc.com/product-detail/Ferrite-Beads_Murata-Electronics-Murata-Electronics-BLM18KG102BH1D_C560058.html
footprint FB-0603 (0603 (1608M) Ferrite)
pins: 1, 2

## BLM18KG102SH1D
designator FB?  Impedance @ Frequency: 1kΩ@100MHz
Ferrite, 1kΩ@100MHz, ±25%, 200mΩ, 1A, SMD 0603; Manufacturer: Murata Electronics; Manufacturer Part Number: BLM18KG102SH1D; Package Size: 0603; JLCPCB Basic Part: No; JLCPCB Part Number: C883597; Supplier 1: LCSC; Category: Ferrite Beads; Supplier Part Number 1: C883597; Tolerance: ±25%; Rated Current: 1A; DC Resistance: 200mΩ; RoHS: Yes; ComponentLink1Description: Datasheet; ComponentLink1URL: https://wmsc.lcsc.com/wmsc/upload/file/pdf/v2/lcsc/2304140030_Murata-Electronics-BLM18KG102SH1D_C883597.pdf; ComponentLink2Description: JLCPCB Part URL; ComponentLink2URL: https://jlcpcb.com/partdetail/C883597; ComponentLink3Description: LCSC Part URL; ComponentLink3URL: https://lcsc.com/product-detail/Ferrite-Beads_Murata-Electronics-Murata-Electronics-BLM18KG102SH1D_C883597.html
footprint FB-0603 (0603 (1608M) Ferrite)
pins: 1, 2

## BLM18KG102SN1D
designator FB?  Impedance @ Frequency: 1kΩ@100MHz
Ferrite, 1kΩ@100MHz, ±25%, 200mΩ, 1A, SMD 0603; Manufacturer: Murata Electronics; Manufacturer Part Number: BLM18KG102SN1D; Package Size: 0603; JLCPCB Basic Part: No; JLCPCB Part Number: C160982; Supplier 1: LCSC; Category: Ferrite Beads; Supplier Part Number 1: C160982; Tolerance: ±25%; Rated Current: 1A; DC Resistance: 200mΩ; RoHS: Yes; ComponentLink1Description: Datasheet; ComponentLink1URL: https://wmsc.lcsc.com/wmsc/upload/file/pdf/v2/lcsc/1810311132_Murata-Electronics-BLM18KG102SN1D_C160982.pdf; ComponentLink2Description: JLCPCB Part URL; ComponentLink2URL: https://jlcpcb.com/partdetail/C160982; ComponentLink3Description: LCSC Part URL; ComponentLink3URL: https://lcsc.com/product-detail/Ferrite-Beads_Murata-Electronics-Murata-Electronics-BLM18KG102SN1D_C160982.html
footprint FB-0603 (0603 (1608M) Ferrite)
pins: 1, 2

## BLM18KG121JH1D
designator FB?  Impedance @ Frequency: 120Ω@100MHz
Ferrite, 120Ω@100MHz, ±25%, 30mΩ, 1.9A, SMD 0603; Manufacturer: Murata Electronics; Manufacturer Part Number: BLM18KG121JH1D; Package Size: 0603; JLCPCB Basic Part: No; JLCPCB Part Number: C560047; Supplier 1: LCSC; Category: Ferrite Beads; Supplier Part Number 1: C560047; Tolerance: ±25%; Rated Current: 1.9A; DC Resistance: 30mΩ; RoHS: Yes; ComponentLink1Description: Datasheet; ComponentLink1URL: https://wmsc.lcsc.com/wmsc/upload/file/pdf/v2/lcsc/2304140030_Murata-Electronics-BLM18KG121JH1D_C560047.pdf; ComponentLink2Description: JLCPCB Part URL; ComponentLink2URL: https://jlcpcb.com/partdetail/C560047; ComponentLink3Description: LCSC Part URL; ComponentLink3URL: https://lcsc.com/product-detail/Ferrite-Beads_Murata-Electronics-Murata-Electronics-BLM18KG121JH1D_C560047.html
footprint FB-0603 (0603 (1608M) Ferrite)
pins: 1, 2

## BLM18KG121TH1D
designator FB?  Impedance @ Frequency: 120Ω@100MHz
Ferrite, 120Ω@100MHz, ±25%, 30mΩ, 3A, SMD 0603; Manufacturer: Murata Electronics; Manufacturer Part Number: BLM18KG121TH1D; Package Size: 0603; JLCPCB Basic Part: No; JLCPCB Part Number: C437404; Supplier 1: LCSC; Category: Ferrite Beads; Supplier Part Number 1: C437404; Tolerance: ±25%; Rated Current: 3A; DC Resistance: 30mΩ; RoHS: Yes; ComponentLink1Description: Datasheet; ComponentLink1URL: https://wmsc.lcsc.com/wmsc/upload/file/pdf/v2/lcsc/2304140030_Murata-Electronics-BLM18KG121TH1D_C437404.pdf; ComponentLink2Description: JLCPCB Part URL; ComponentLink2URL: https://jlcpcb.com/partdetail/C437404; ComponentLink3Description: LCSC Part URL; ComponentLink3URL: https://lcsc.com/product-detail/Ferrite-Beads_Murata-Electronics-Murata-Electronics-BLM18KG121TH1D_C437404.html
footprint FB-0603 (0603 (1608M) Ferrite)
pins: 1, 2

## BLM18KG121TN1D
designator FB?  Impedance @ Frequency: 120Ω@100MHz
Ferrite, 120Ω@100MHz, ±25%, 30mΩ, 3A, SMD 0603; Manufacturer: Murata Electronics; Manufacturer Part Number: BLM18KG121TN1D; Package Size: 0603; JLCPCB Basic Part: No; JLCPCB Part Number: C85831; Supplier 1: LCSC; Category: Ferrite Beads; Supplier Part Number 1: C85831; Tolerance: ±25%; Rated Current: 3A; DC Resistance: 30mΩ; RoHS: Yes; ComponentLink1Description: Datasheet; ComponentLink1URL: https://wmsc.lcsc.com/wmsc/upload/file/pdf/v2/lcsc/2304140030_Murata-Electronics-BLM18KG121TN1D_C85831.pdf; ComponentLink2Description: JLCPCB Part URL; ComponentLink2URL: https://jlcpcb.com/partdetail/C85831; ComponentLink3Description: LCSC Part URL; ComponentLink3URL: https://lcsc.com/product-detail/Ferrite-Beads_Murata-Electronics-Murata-Electronics-BLM18KG121TN1D_C85831.html
footprint FB-0603 (0603 (1608M) Ferrite)
pins: 1, 2

## BLM18KG121TZ1D
designator FB?  Impedance @ Frequency: 120Ω@100MHz
Ferrite, 120Ω@100MHz, ±25%, 30mΩ, 3A, SMD 0603; Manufacturer: Murata Electronics; Manufacturer Part Number: BLM18KG121TZ1D; Package Size: 0603; JLCPCB Basic Part: No; JLCPCB Part Number: C396652; Supplier 1: LCSC; Category: Ferrite Beads; Supplier Part Number 1: C396652; Tolerance: ±25%; Rated Current: 3A; DC Resistance: 30mΩ; RoHS: Yes; ComponentLink1Description: Datasheet; ComponentLink1URL: https://wmsc.lcsc.com/wmsc/upload/file/pdf/v2/lcsc/1912111437_Murata-Electronics-BLM18KG121TZ1D_C396652.pdf; ComponentLink2Description: JLCPCB Part URL; ComponentLink2URL: https://jlcpcb.com/partdetail/C396652; ComponentLink3Description: LCSC Part URL; ComponentLink3URL: https://lcsc.com/product-detail/Ferrite-Beads_Murata-Electronics-Murata-Electronics-BLM18KG121TZ1D_C396652.html
footprint FB-0603 (0603 (1608M) Ferrite)
pins: 1, 2

## BLM18KG221BH1D
designator FB?  Impedance @ Frequency: 220Ω@100MHz
Ferrite, 220Ω@100MHz, 50mΩ, SMD 0603; Manufacturer: Murata Electronics; Manufacturer Part Number: BLM18KG221BH1D; Package Size: 0603; JLCPCB Basic Part: No; JLCPCB Part Number: C560053; Supplier 1: LCSC; Category: Ferrite Beads; Supplier Part Number 1: C560053; DC Resistance: 50mΩ; RoHS: Yes; ComponentLink1Description: Datasheet; ComponentLink1URL: https://wmsc.lcsc.com/wmsc/upload/file/pdf/v2/lcsc/2304140030_Murata-Electronics-BLM18KG221BH1D_C560053.pdf; ComponentLink2Description: JLCPCB Part URL; ComponentLink2URL: https://jlcpcb.com/partdetail/C560053; ComponentLink3Description: LCSC Part URL; ComponentLink3URL: https://lcsc.com/product-detail/Ferrite-Beads_Murata-Electronics-Murata-Electronics-BLM18KG221BH1D_C560053.html
pins: 1, 2

## BLM18KG221SH1D
designator FB?  Impedance @ Frequency: 220Ω@100MHz
Ferrite, 220Ω@100MHz, ±25%, 50mΩ, 2.2A, SMD 0603; Manufacturer: Murata Electronics; Manufacturer Part Number: BLM18KG221SH1D; Package Size: 0603; JLCPCB Basic Part: No; JLCPCB Part Number: C527991; Supplier 1: LCSC; Category: Ferrite Beads; Supplier Part Number 1: C527991; Tolerance: ±25%; Rated Current: 2.2A; DC Resistance: 50mΩ; RoHS: Yes; ComponentLink1Description: Datasheet; ComponentLink1URL: https://wmsc.lcsc.com/wmsc/upload/file/pdf/v2/lcsc/2007231106_Murata-Electronics-BLM18KG221SH1D_C527991.pdf; ComponentLink2Description: JLCPCB Part URL; ComponentLink2URL: https://jlcpcb.com/partdetail/C527991; ComponentLink3Description: LCSC Part URL; ComponentLink3URL: https://lcsc.com/product-detail/Ferrite-Beads_Murata-Electronics-Murata-Electronics-BLM18KG221SH1D_C527991.html
footprint FB-0603 (0603 (1608M) Ferrite)
pins: 1, 2

## BLM18KG221SN1D
designator FB?  Impedance @ Frequency: 220Ω@100MHz
Ferrite, 220Ω@100MHz, ±25%, 50mΩ, 2.2A, SMD 0603; Manufacturer: Murata Electronics; Manufacturer Part Number: BLM18KG221SN1D; Package Size: 0603; JLCPCB Basic Part: No; JLCPCB Part Number: C88980; Supplier 1: LCSC; Category: Ferrite Beads; Supplier Part Number 1: C88980; Tolerance: ±25%; Rated Current: 2.2A; DC Resistance: 50mΩ; RoHS: Yes; ComponentLink1Description: Datasheet; ComponentLink1URL: https://wmsc.lcsc.com/wmsc/upload/file/pdf/v2/lcsc/2304140030_Murata-Electronics-BLM18KG221SN1D_C88980.pdf; ComponentLink2Description: JLCPCB Part URL; ComponentLink2URL: https://jlcpcb.com/partdetail/C88980; ComponentLink3Description: LCSC Part URL; ComponentLink3URL: https://lcsc.com/product-detail/Ferrite-Beads_Murata-Electronics-Murata-Electronics-BLM18KG221SN1D_C88980.html
footprint FB-0603 (0603 (1608M) Ferrite)
pins: 1, 2

## BLM18KG221SZ1D
designator FB?  Impedance @ Frequency: 220Ω@100MHz
Ferrite, 220Ω@100MHz, ±25%, 50mΩ, 2.2A, SMD 0603; Manufacturer: Murata Electronics; Manufacturer Part Number: BLM18KG221SZ1D; Package Size: 0603; JLCPCB Basic Part: No; JLCPCB Part Number: C2661662; Supplier 1: LCSC; Category: Ferrite Beads; Supplier Part Number 1: C2661662; Tolerance: ±25%; Rated Current: 2.2A; DC Resistance: 50mΩ; RoHS: Yes; ComponentLink1Description: Datasheet; ComponentLink1URL: https://wmsc.lcsc.com/wmsc/upload/file/pdf/v2/lcsc/2304140030_Murata-Electronics-BLM18KG221SZ1D_C2661662.pdf; ComponentLink2Description: JLCPCB Part URL; ComponentLink2URL: https://jlcpcb.com/partdetail/C2661662; ComponentLink3Description: LCSC Part URL; ComponentLink3URL: https://lcsc.com/product-detail/Ferrite-Beads_Murata-Electronics-Murata-Electronics-BLM18KG221SZ1D_C2661662.html
footprint FB-0603 (0603 (1608M) Ferrite)
pins: 1, 2

## BLM18KG260TH1D
designator FB?  Impedance @ Frequency: 26Ω@100MHz
Ferrite, 26Ω@100MHz, ±25%, 7mΩ, 6A, SMD 0603; Manufacturer: Murata Electronics; Manufacturer Part Number: BLM18KG260TH1D; Package Size: 0603; JLCPCB Basic Part: No; JLCPCB Part Number: C710372; Supplier 1: LCSC; Category: Ferrite Beads; Supplier Part Number 1: C710372; Tolerance: ±25%; Rated Current: 6A; DC Resistance: 7mΩ; RoHS: Yes; ComponentLink1Description: Datasheet; ComponentLink1URL: https://wmsc.lcsc.com/wmsc/upload/file/pdf/v2/lcsc/2304140030_Murata-Electronics-BLM18KG260TH1D_C710372.pdf; ComponentLink2Description: JLCPCB Part URL; ComponentLink2URL: https://jlcpcb.com/partdetail/C710372; ComponentLink3Description: LCSC Part URL; ComponentLink3URL: https://lcsc.com/product-detail/Ferrite-Beads_Murata-Electronics-Murata-Electronics-BLM18KG260TH1D_C710372.html
footprint FB-0603 (0603 (1608M) Ferrite)
pins: 1, 2

## BLM18KG260TN1D
designator FB?  Impedance @ Frequency: 26Ω@100MHz
Ferrite, 26Ω@100MHz, ±25%, 7mΩ, 6A, SMD 0603; Manufacturer: Murata Electronics; Manufacturer Part Number: BLM18KG260TN1D; Package Size: 0603; JLCPCB Basic Part: No; JLCPCB Part Number: C88981; Supplier 1: LCSC; Category: Ferrite Beads; Supplier Part Number 1: C88981; Tolerance: ±25%; Rated Current: 6A; DC Resistance: 7mΩ; RoHS: Yes; ComponentLink1Description: Datasheet; ComponentLink1URL: https://wmsc.lcsc.com/wmsc/upload/file/pdf/v2/lcsc/2304140030_Murata-Electronics-BLM18KG260TN1D_C88981.pdf; ComponentLink2Description: JLCPCB Part URL; ComponentLink2URL: https://jlcpcb.com/partdetail/C88981; ComponentLink3Description: LCSC Part URL; ComponentLink3URL: https://lcsc.com/product-detail/Ferrite-Beads_Murata-Electronics-Murata-Electronics-BLM18KG260TN1D_C88981.html
footprint FB-0603 (0603 (1608M) Ferrite)
pins: 1, 2

## BLM18KG260TZ1D
designator FB?  Impedance @ Frequency: 26Ω@100MHz
Ferrite, 26Ω@100MHz, ±25%, 7mΩ, 6A, SMD 0603; Manufacturer: Murata Electronics; Manufacturer Part Number: BLM18KG260TZ1D; Package Size: 0603; JLCPCB Basic Part: No; JLCPCB Part Number: C701293; Supplier 1: LCSC; Category: Ferrite Beads; Supplier Part Number 1: C701293; Tolerance: ±25%; Rated Current: 6A; DC Resistance: 7mΩ; RoHS: Yes; ComponentLink1Description: Datasheet; ComponentLink1URL: https://wmsc.lcsc.com/wmsc/upload/file/pdf/v2/lcsc/2304140030_Murata-Electronics-BLM18KG260TZ1D_C701293.pdf; ComponentLink2Description: JLCPCB Part URL; ComponentLink2URL: https://jlcpcb.com/partdetail/C701293; ComponentLink3Description: LCSC Part URL; ComponentLink3URL: https://lcsc.com/product-detail/Ferrite-Beads_Murata-Electronics-Murata-Electronics-BLM18KG260TZ1D_C701293.html
footprint FB-0603 (0603 (1608M) Ferrite)
pins: 1, 2

## BLM18KG300JH1D
designator FB?  Impedance @ Frequency: 30Ω@100MHz
Ferrite, 30Ω@100MHz, ±25%, 10mΩ, 3.3A, SMD 0603; Manufacturer: Murata Electronics; Manufacturer Part Number: BLM18KG300JH1D; Package Size: 0603; JLCPCB Basic Part: No; JLCPCB Part Number: C710373; Supplier 1: LCSC; Category: Ferrite Beads; Supplier Part Number 1: C710373; Tolerance: ±25%; Rated Current: 3.3A; DC Resistance: 10mΩ; RoHS: Yes; ComponentLink1Description: Datasheet; ComponentLink1URL: https://wmsc.lcsc.com/wmsc/upload/file/pdf/v2/lcsc/2304140030_Murata-Electronics-BLM18KG300JH1D_C710373.pdf; ComponentLink2Description: JLCPCB Part URL; ComponentLink2URL: https://jlcpcb.com/partdetail/C710373; ComponentLink3Description: LCSC Part URL; ComponentLink3URL: https://lcsc.com/product-detail/Ferrite-Beads_Murata-Electronics-Murata-Electronics-BLM18KG300JH1D_C710373.html
footprint FB-0603 (0603 (1608M) Ferrite)
pins: 1, 2

## BLM18KG300TH1D
designator FB?  Impedance @ Frequency: 30Ω@100MHz
Ferrite, 30Ω@100MHz, ±25%, 10mΩ, 5A, SMD 0603; Manufacturer: Murata Electronics; Manufacturer Part Number: BLM18KG300TH1D; Package Size: 0603; JLCPCB Basic Part: No; JLCPCB Part Number: C710374; Supplier 1: LCSC; Category: Ferrite Beads; Supplier Part Number 1: C710374; Tolerance: ±25%; Rated Current: 5A; DC Resistance: 10mΩ; RoHS: Yes; ComponentLink1Description: Datasheet; ComponentLink1URL: https://wmsc.lcsc.com/wmsc/upload/file/pdf/v2/lcsc/2304140030_Murata-Electronics-BLM18KG300TH1D_C710374.pdf; ComponentLink2Description: JLCPCB Part URL; ComponentLink2URL: https://jlcpcb.com/partdetail/C710374; ComponentLink3Description: LCSC Part URL; ComponentLink3URL: https://lcsc.com/product-detail/Ferrite-Beads_Murata-Electronics-Murata-Electronics-BLM18KG300TH1D_C710374.html
footprint FB-0603 (0603 (1608M) Ferrite)
pins: 1, 2
